# Altium footprint library Miscellaneous Devices LC.PcbLib: 776 footprints (part 9 of 49)
Each footprint in its own frame and in the unit in brackets; x right, y up, seen from the top. Pads: shape width x height; smd on the part's side, far side on the other; paste and mask are expansions set on the pad; w line width, h text height; cw(c..) or ccw(c..) is an arc to the next point about the centre after c.
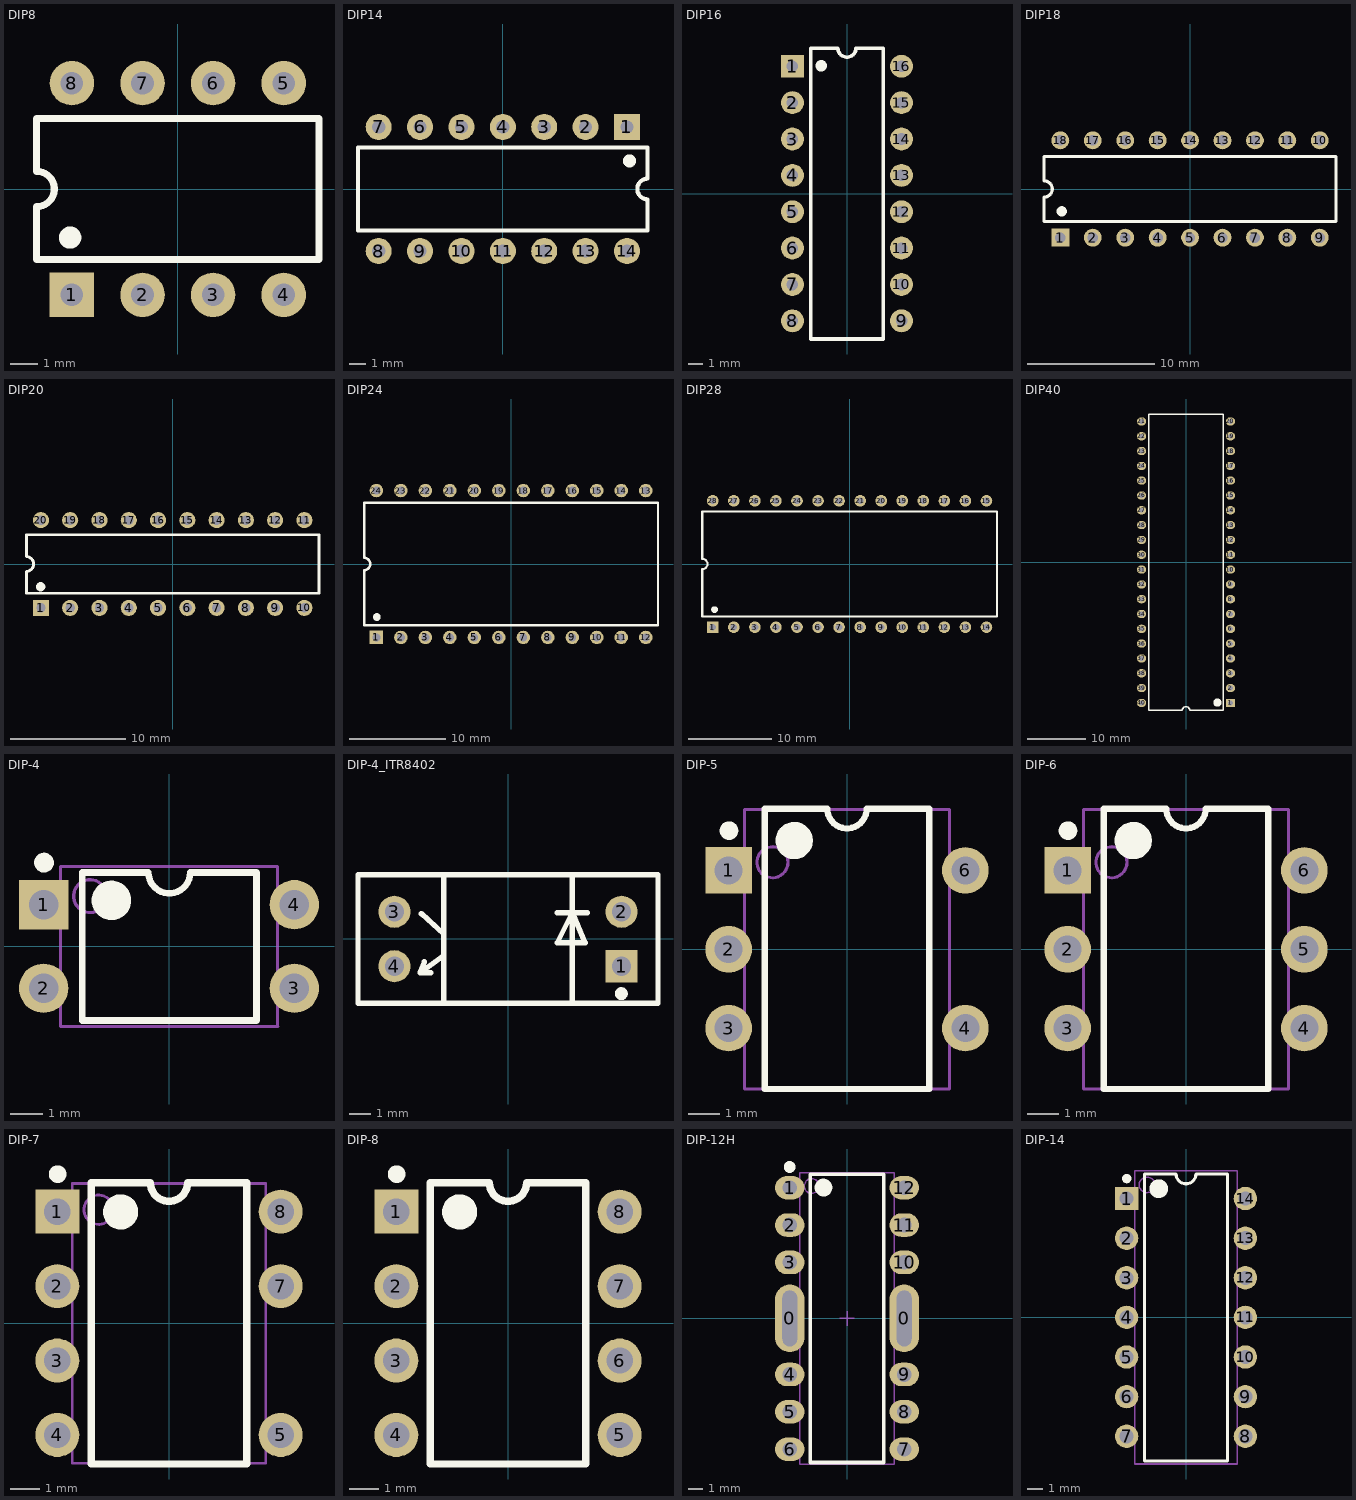
[diagram p8: the footprints below, top view; thin cyan lines are the x and y axes]

## DIP8 [mm]
pads (8):
  rect 1.6x1.6 hole 0.813: 1(-3.81,-3.81)
  round 1.6 hole 0.813: 2(-1.27,-3.81) 3(1.27,-3.81) 4(3.81,-3.81) 5(3.81,3.81) 6(1.27,3.81) 7(-1.27,3.81) 8(-3.81,3.81)
Top Overlay:
  circle w0.5: c-3.875,-1.75 r0.15
  lines w0.254: -5.08,-2.54 5.08,-2.54 5.08,2.54 -5.08,2.54 -5.08,0.635 cw(c-5.08,0) -5.08,-0.635 -5.08,-2.54
3D body "DIP8.STEP": height 5.08, standoff -3.5, extent -5.527,-4.027 5.393,3.843

## DIP14 [mm]
pads (14):
  rect 1.6x1.6 hole 0.813: 1(7.62,3.81)
  round 1.6 hole 0.813: 2(5.08,3.81) 3(2.54,3.81) 4(0,3.81) 5(-2.54,3.81) 6(-5.08,3.81) 7(-7.62,3.81) 8(-7.62,-3.81) 9(-5.08,-3.81) 10(-2.54,-3.81) 11(0,-3.81) 12(2.54,-3.81) 13(5.08,-3.81) 14(7.62,-3.81)
Top Overlay:
  circle w0.5: c7.775,1.725 r0.15
  lines w0.254: -8.89,-2.54 -8.89,2.54 8.89,2.54 8.89,0.635 ccw(c8.89,0) 8.89,-0.635 8.89,-2.54 -8.89,-2.54
3D body "DIP14.STEP": height 5.1, standoff -3.3, extent -10,-3.81 10,4.06

## DIP16 [mm]
pads (16):
  rect 1.6x1.6 hole 0.813: 1(-3.814,8.89)
  round 1.6 hole 0.813: 2(-3.814,6.35) 3(-3.814,3.81) 4(-3.814,1.27) 5(-3.814,-1.27) 6(-3.814,-3.81) 7(-3.814,-6.35) 8(-3.814,-8.89) 9(3.814,-8.89) 10(3.806,-6.35) 11(3.806,-3.81) 12(3.806,-1.27) 13(3.806,1.27) 14(3.806,3.81) 15(3.806,6.35) 16(3.806,8.89)
Top Overlay:
  circle w0.5: c-1.8,8.925 r0.15
  lines w0.254: -2.544,-10.16 -2.544,10.16 -0.639,10.16 ccw(c-0.004,10.16) 0.631,10.16 2.536,10.16 2.536,-10.16 -2.544,-10.16
3D body "DIP16.STEP": height 5.1, standoff -3.3, extent -3.933,-9.873 3.937,10.127

## DIP18 [mm]
pads (18):
  rect 1.4x1.4 hole 0.813: 1(-10.16,-3.81)
  round 1.4 hole 0.813: 2(-7.62,-3.81) 3(-5.08,-3.81) 4(-2.54,-3.81) 5(0,-3.81) 6(2.54,-3.81) 7(5.08,-3.81) 8(7.62,-3.81) 9(10.16,-3.81) 10(10.16,3.81) 11(7.62,3.81) 12(5.08,3.81) 13(2.54,3.81) 14(0,3.81) 15(-2.54,3.81) 16(-5.08,3.81) 17(-7.62,3.81) 18(-10.16,3.81)
Top Overlay:
  circle w0.5: c-10.05,-1.75 r0.15
  lines w0.254: -11.43,-2.54 11.43,-2.54 11.43,2.54 -11.43,2.54 -11.43,0.635 cw(c-11.43,0) -11.43,-0.635 -11.43,-2.54
3D body "DIP18.STEP": height 5.5, standoff -2.5, extent -11.43,-3.937 11.43,3.81

## DIP20 [mm]
pads (20):
  rect 1.4x1.4 hole 0.813: 1(-11.43,-3.81)
  round 1.4 hole 0.813: 2(-8.89,-3.81) 3(-6.35,-3.81) 4(-3.81,-3.81) 5(-1.27,-3.81) 6(1.27,-3.81) 7(3.81,-3.81) 8(6.35,-3.81) 9(8.89,-3.81) 10(11.43,-3.81) 11(11.43,3.81) 12(8.89,3.81) 13(6.35,3.81) 14(3.81,3.81) 15(1.27,3.81) 16(-1.27,3.81) 17(-3.81,3.81) 18(-6.35,3.81) 19(-8.89,3.81) 20(-11.43,3.81)
Top Overlay:
  circle w0.5: c-11.45,-1.975 r0.15
  lines w0.254: -12.7,-2.54 12.7,-2.54 12.7,2.54 -12.7,2.54 -12.7,0.635 cw(c-12.7,0) -12.7,-0.635 -12.7,-2.54
3D body "DIP20.step": height 4.5, standoff -3.5, extent -12.891,-4.05 12.709,3.711

## DIP24 [mm]
pads (24):
  rect 1.4x1.4 hole 0.813: 1(-13.97,-7.62)
  round 1.4 hole 0.813: 2(-11.43,-7.62) 3(-8.89,-7.62) 4(-6.35,-7.62) 5(-3.81,-7.62) 6(-1.27,-7.62) 7(1.27,-7.62) 8(3.81,-7.62) 9(6.35,-7.62) 10(8.89,-7.62) 11(11.43,-7.62) 12(13.97,-7.62) 13(13.97,7.62) 14(11.43,7.62) 15(8.89,7.62) 16(6.35,7.62) 17(3.81,7.62) 18(1.27,7.62) 19(-1.27,7.62) 20(-3.81,7.62) 21(-6.35,7.62) 22(-8.89,7.62) 23(-11.43,7.62) 24(-13.97,7.62)
Top Overlay:
  circle w0.5: c-13.925,-5.5 r0.15
  lines w0.254: -15.24,-6.35 -15.24,-0.635 ccw(c-15.24,0) -15.24,0.635 -15.24,6.35 15.24,6.35 15.24,-6.35 -15.24,-6.35
3D body "DIP24.STEP": height 5.79, standoff -3.3, extent -16.256,-7.491 16.384,7.745

## DIP28 [mm]
pads (28):
  rect 1.4x1.4 hole 0.813: 1(-16.51,-7.62)
  round 1.4 hole 0.813: 2(-13.97,-7.62) 3(-11.43,-7.62) 4(-8.89,-7.62) 5(-6.35,-7.62) 6(-3.81,-7.62) 7(-1.27,-7.62) 8(1.27,-7.62) 9(3.81,-7.62) 10(6.35,-7.62) 11(8.89,-7.62) 12(11.43,-7.62) 13(13.97,-7.62) 14(16.51,-7.62) 15(16.51,7.62) 16(13.97,7.62) 17(11.43,7.62) 18(8.89,7.62) 19(6.35,7.62) 20(3.81,7.62) 21(1.27,7.62) 22(-1.27,7.62) 23(-3.81,7.62) 24(-6.35,7.62) 25(-8.89,7.62) 26(-11.43,7.62) 27(-13.97,7.62) 28(-16.51,7.62)
Top Overlay:
  circle w0.5: c-16.3,-5.5 r0.15
  lines w0.254: -17.78,-6.35 17.78,-6.35 17.78,6.35 -17.78,6.35 -17.78,0.635 cw(c-17.78,0) -17.78,-0.635 -17.78,-6.35
3D body "DIP28.STEP": height 5.79, standoff -3.3, extent -18.544,-7.745 18.796,7.491

## DIP40 [mm]
pads (40):
  rect 1.6x1.4 hole 0.813: 1(7.62,-24.13)
  oval 1.6x1.4 hole 0.813: 2(7.62,-21.59) 3(7.62,-19.05) 4(7.62,-16.51) 5(7.62,-13.97) 6(7.62,-11.43) 7(7.62,-8.89) 8(7.62,-6.35) 9(7.62,-3.81) 10(7.62,-1.27) 11(7.62,1.27) 12(7.62,3.81) 13(7.62,6.35) 14(7.62,8.89) 15(7.62,11.43) 16(7.62,13.97) 17(7.62,16.51) 18(7.62,19.05) 19(7.62,21.59) 20(7.62,24.13) 21(-7.62,24.13) 22(-7.62,21.59) 23(-7.62,19.05) 24(-7.62,16.51) 25(-7.62,13.97) 26(-7.62,11.43) 27(-7.62,8.89) 28(-7.62,6.35) 29(-7.62,3.81) 30(-7.62,1.27) 31(-7.62,-1.27) 32(-7.62,-3.81) 33(-7.62,-6.35) 34(-7.62,-8.89) 35(-7.62,-11.43) 36(-7.62,-13.97) 37(-7.62,-16.51) 38(-7.62,-19.05) 39(-7.62,-21.59) 40(-7.62,-24.13)
Top Overlay:
  circle w1: c5.4,-24.075 r0.2
  lines w0.254: -6.35,-25.4 -0.635,-25.4 cw(c0,-25.4) 0.635,-25.4 6.35,-25.4 6.35,25.4 -6.35,25.4 -6.35,-25.4
3D body "DIP40.STEP": height 5.79, standoff -3.3, extent -7.62,-26.416 7.666,26.184

## DIP-4 [mm]
pads (4):
  rect 1.5x1.5 hole 0.9: 1(-3.81,1.27)
  round 1.5 hole 0.9: 2(-3.81,-1.27) 3(3.81,-1.27) 4(3.81,1.27)
Top Overlay:
  circle w0.6: c-1.75,1.4 r0.3
  circle w0.3: c-3.8,2.55 r0.15
  lines w0.2: -2.64,-2.25 -2.64,2.25 -0.625,2.25 ccw(c0.01,2.25) 0.645,2.25 2.66,2.25 2.66,-2.25 -2.64,-2.25
Mechanical 13:
  circle w0.1: c-2.4,1.53 r0.5
  lines w0.1: -3.3,-2.43 -3.3,2.43 3.3,2.43 3.3,-2.43 ; -3.29,-2.43 3.31,-2.43

## DIP-4_ITR8402 [mm] "光电开关"
height 12
pads (4):
  rect 1.5x1.5 hole 0.9: 1(5.3,-1.27)
  round 1.5 hole 0.9: 2(5.3,1.27) 3(-5.3,1.27) 4(-5.3,-1.27)
Top Overlay:
  circle w0.3: c5.29,-2.55 r0.15
  lines w0.254: -4.042,1.185 -3,0.23 -3,-0.77 -4.1,-1.57 ; -3.9,-1.07 -4.1,-1.57 ; -3.6,-1.57 -4.1,-1.57 ; -3,-3 -3,3 ; 2.3,1.23 3.7,1.23 ; 3,-3 3,3 ; -7,-3 7,-3 7,3 -7,3 -7,-3 ; 2.3,-0.17 3,1.23 3.6,-0.17 2.3,-0.17

## DIP-5 [mm]
pads (5):
  rect 1.5x1.5 hole 0.9: 1(-3.81,2.54)
  round 1.5 hole 0.9: 2(-3.81,0) 3(-3.81,-2.54) 4(3.81,-2.54) 6(3.81,2.54)
Top Overlay:
  circle w0.6: c-1.7,3.5 r0.3
  circle w0.3: c-3.8,3.82 r0.15
  lines w0.2: -2.65,-4.5 -2.65,4.525 -0.635,4.525 ccw(c0,4.525) 0.635,4.525 2.65,4.525 2.65,-4.5 -2.65,-4.5
Mechanical 13:
  circle w0.1: c-2.4,2.8 r0.5
  lines w0.1: -3.3,-4.5 -3.3,4.5 3.3,4.5 3.3,-4.5 -3.3,-4.5

## DIP-6 [mm]
pads (6):
  rect 1.5x1.5 hole 0.9: 1(-3.81,2.54)
  round 1.5 hole 0.9: 2(-3.81,0) 3(-3.81,-2.54) 4(3.81,-2.54) 5(3.81,0) 6(3.81,2.54)
Top Overlay:
  circle w0.3: c-3.8,3.82 r0.15
  circle w0.6: c-1.7,3.5 r0.3
  lines w0.2: -2.65,-4.5 2.65,-4.5 2.65,4.525 0.635,4.525 cw(c0,4.525) -0.635,4.525 -2.65,4.525 -2.65,-4.5
Mechanical 13:
  circle w0.1: c-2.4,2.8 r0.5
  lines w0.1: -3.3,-4.5 3.3,-4.5 3.3,4.5 -3.3,4.5 -3.3,-4.5

## DIP-7 [mm]
pads (7):
  rect 1.5x1.5 hole 0.9: 1(-3.81,3.81)
  round 1.5 hole 0.9: 2(-3.81,1.27) 3(-3.81,-1.27) 4(-3.81,-3.81) 5(3.81,-3.81) 7(3.81,1.27) 8(3.81,3.81)
Top Overlay:
  circle w0.3: c-3.8,5.09 r0.15
  circle w0.6: c-1.65,3.8 r0.3
  lines w0.254: -2.65,-4.8 -2.65,4.8 -0.635,4.8 ccw(c0,4.8) 0.635,4.8 2.65,4.8 2.65,-4.8 -2.65,-4.8
Mechanical 13:
  circle w0.1: c-2.4,3.875 r0.5
  lines w0.1: -3.3,-4.775 -3.3,4.775 3.3,4.775 3.3,-4.775 -3.3,-4.775

## DIP-8 [mm]
pads (8):
  rect 1.5x1.5 hole 0.9: 1(-3.81,3.81)
  round 1.5 hole 0.9: 2(-3.81,1.27) 3(-3.81,-1.27) 4(-3.81,-3.81) 5(3.81,-3.81) 6(3.81,-1.27) 7(3.81,1.27) 8(3.81,3.81)
Top Overlay:
  circle w0.6: c-1.65,3.8 r0.3
  circle w0.3: c-3.8,5.09 r0.15
  lines w0.254: -2.65,-4.8 2.65,-4.8 2.65,4.8 0.635,4.8 cw(c0,4.8) -0.635,4.8 -2.65,4.8 -2.65,-4.8
3D body "SW3dPS-DIP08-300.STEP": height 5.08, standoff -2.49, extent -3.935,-5.46 3.935,5.46

## DIP-12H [mm] "=12-DIPH-300"
pads (14):
  oval 2x4.6 hole 1 slot 3.8 at 90 deg: 0(-3.89,0) 0(3.89,0)
  oval 2x1.6 hole 1: 1(-3.89,8.89) 2(-3.89,6.35) 3(-3.89,3.81) 4(-3.89,-3.81) 5(-3.89,-6.35) 6(-3.89,-8.89) 7(3.89,-8.89) 8(3.89,-6.35) 9(3.89,-3.81) 10(3.89,3.81) 11(3.89,6.35) 12(3.89,8.89)
Top Overlay:
  circle w0.4: c-3.9,10.3 r0.2
  circle w0.6: c-1.6,8.9 r0.3
  lines w0.254: -2.5,-9.8 2.5,-9.8 2.5,9.8 -2.5,9.8 -2.5,-9.8
Mechanical 13:
  circle w0.1: c-2.4,9 r0.5
  lines w0.1: -3.2,-9.9 -3.2,9.9 3.2,9.9 3.2,-9.9 -3.2,-9.9
Mechanical 15:
  lines w0.1: -0.5,0 0.5,0 ; 0,-0.5 0,0.5

## DIP-14 [mm]
pads (14):
  rect 1.5x1.5 hole 0.9: 1(-3.81,7.62)
  round 1.5 hole 0.9: 2(-3.81,5.08) 3(-3.81,2.54) 4(-3.81,0) 5(-3.81,-2.54) 6(-3.81,-5.08) 7(-3.81,-7.62) 8(3.81,-7.62) 9(3.81,-5.08) 10(3.81,-2.54) 11(3.81,0) 12(3.81,2.54) 13(3.81,5.08) 14(3.81,7.62)
Top Overlay:
  circle w0.6: c-1.75,8.25 r0.3
  circle w0.3: c-3.8,8.9 r0.15
  lines w0.2: -2.65,-9.2 2.65,-9.2 2.65,9.2 0.635,9.2 cw(c0,9.2) -0.635,9.2 -2.65,9.2 -2.65,-9.2
Mechanical 13:
  circle w0.1: c-2.5,8.5 r0.5
  lines w0.1: -3.3,-9.4 -3.3,9.4 3.3,9.4 3.3,-9.4 -3.3,-9.4